# Altium footprint library Component.PcbLib: 115 footprints (part 5 of 8)
Each footprint in its own frame and in the unit in brackets; x right, y up, seen from the top. Pads: shape width x height; smd on the part's side, far side on the other; paste and mask are expansions set on the pad; w line width, h text height; cw(c..) or ccw(c..) is an arc to the next point about the centre after c.
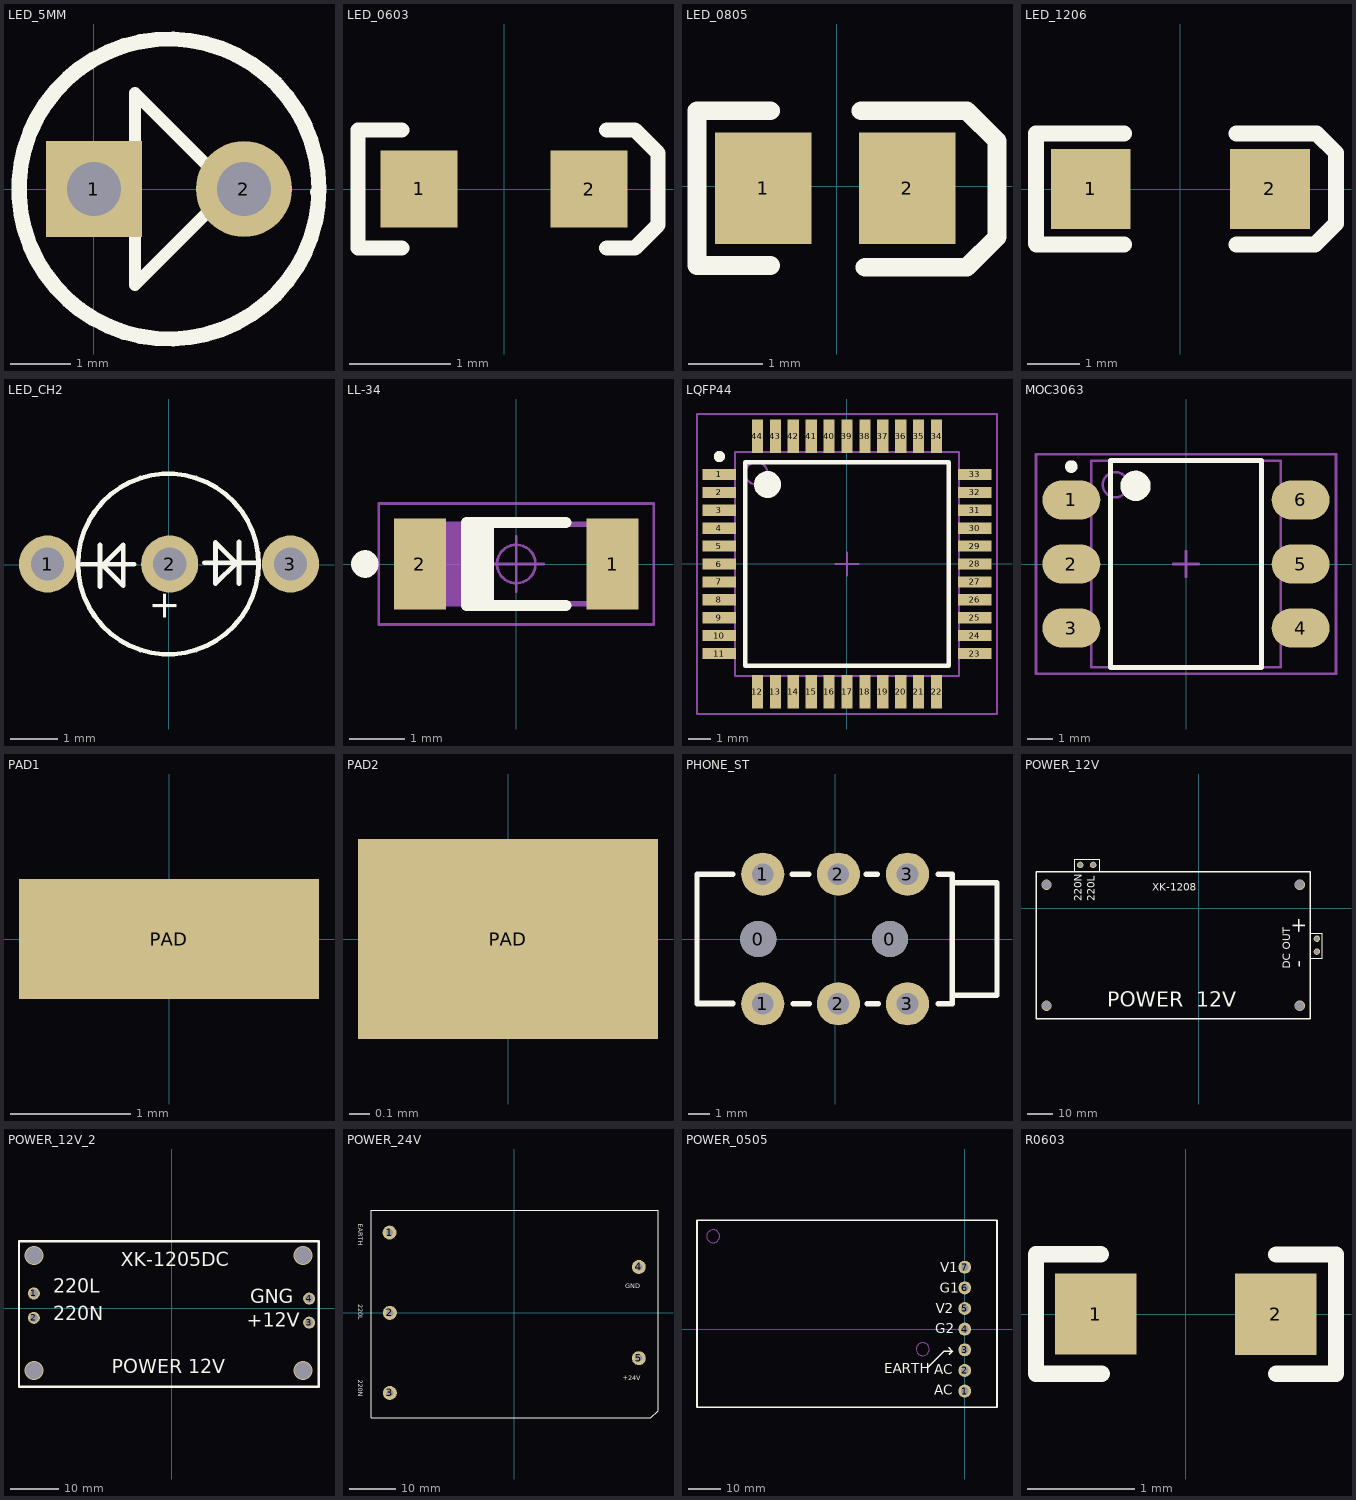
[diagram p4: the footprints below, top view; thin cyan lines are the x and y axes]

## LED_5MM [mm]
height 1.99
pads (2):
  rect 1.6x1.6 hole 0.9: 1(0,0)
  round 1.6 hole 0.9: 2(2.5,0)
Top Overlay:
  circle w0.254: c1.25,0 r2.5
  lines w0.2: 3.7,-0.05 3.75,0 ; 0.68,-1.6 0.68,1.6 2.28,0 0.68,-1.6
3D body: height 9.5, standoff -4, extent -1.476,-3 4.024,3

## LED_0603 [mil]
pads (2):
  rect 30x30 smd: 1(-33.16,0.03) 2(33.16,-0.03)
Top Overlay:
  lines w6: -40,-23 -57,-23 -57,23 -40,23 ; 40,-23 51,-23 60,-14 60,14 51,23 40,23
3D body: height 17.72, standoff 0, extent -31.89,-15.35 31.1,16.14

## LED_0805 [mm]
pads (2):
  rect 1.3x1.5 smd: 1(-0.991,-0.025) 2(0.95,-0.025)
Top Overlay:
  lines w0.254: -0.889,-1.067 -1.88,-1.067 -1.88,1.016 -0.889,1.016 ; 0.33,1.016 1.753,1.016 2.159,0.61 2.159,-0.686 1.753,-1.092 0.381,-1.092
3D body: height 1.1, standoff 0, extent -0.98,-0.655 1.04,0.595

## LED_1206 [mil]
pads (2):
  rect 60x60 smd: 1(-67.5,0) 2(67.5,0)
Top Overlay:
  lines w12: -108.76,-40.94 -108.76,41.73 -42.5,41.73 ; -108.37,-41.73 -42.62,-41.73 ; 42.42,-41.73 101.48,-41.73 116.04,-27.17 117.22,-25.98 117.22,27.17 102.66,41.73 101.87,41.73 42.42,41.73
3D body: height 43.81, standoff -15.9, extent -64.18,-31.89 61.82,31.11

## LED_CH2 [mm]
pads (3):
  round 1.2 hole 0.7: 1(-2.555,0.015) 2(0.015,0.015) 3(2.555,0.015)
Top Overlay:
  circle w0.1: c-0.015,0.015 r1.9
  lines w0.1: -1.83,0.01 -0.73,0.01 ; -1.45,-0.46 -1.45,0.42 ; 0.74,0.04 1.86,0.04 ; 1.47,-0.395 1.47,0.485 ; -1.39,-0.01 -0.96,0.42 -0.96,-0.44 -1.39,-0.01 ; 0.98,-0.395 0.98,0.465 1.41,0.035 0.98,-0.395
  text "+" at 0.365,-1.195 h1

## LL-34 [mm]
pads (2):
  rect 0.95x1.65 smd: 1(1.75,0) 2(-1.75,0)
Top Overlay:
  circle w0.25: c-2.75,0 r0.125
  lines w0.2: -0.7,-0.75 -0.7,0.75 ; -0.5,-0.75 -0.5,0.75 ; 0.9,-0.75 -0.9,-0.75 -0.9,0.75 0.9,0.75
Mechanical 15:
  lines w0.1: -1.65,-0.725 -1.65,0.725 ; -1.55,-0.725 -1.55,0.725 ; -1.45,-0.725 -1.45,0.725 ; -1.35,-0.725 -1.35,0.725 ; -1.25,-0.725 -1.25,0.725 ; -1.15,-0.725 -1.15,0.725 ; -1.05,-0.725 -1.05,0.725 ; -1.75,-0.725 1.75,-0.725 1.75,0.725 -1.75,0.725 -1.75,-0.725
Mechanical 16:
  circle w0.05: c0,0 r0.35
  lines w0.001: -1.8,-0.75 1.8,-0.75 1.8,0.75 -1.8,0.75 -1.8,-0.75
  lines w0.05: -0.5,0 0.5,0 ; 0,-0.5 0,0.5 ; -2.5,-1.1 2.5,-1.1 2.5,1.1 -2.5,1.1 -2.5,-1.1
3D body: height 1.5, standoff 0, extent -1.75,-0.75 1.75,0.75

## LQFP44 [mm] "TQFP, 44-Leads, Body 12.0x12.0mm (max), Pitch 0.80mm, IPC Medium Density"
height 1.6
pads (44):
  rect 1.5x0.5 smd: 1(-5.7,4) 2(-5.7,3.2) 3(-5.7,2.4) 4(-5.7,1.6) 5(-5.7,0.8) 6(-5.7,0) 7(-5.7,-0.8) 8(-5.7,-1.6) 9(-5.7,-2.4) 10(-5.7,-3.2) 11(-5.7,-4) 23(5.7,-4) 24(5.7,-3.2) 25(5.7,-2.4) 26(5.7,-1.6) 27(5.7,-0.8) 28(5.7,0) 29(5.7,0.8) 30(5.7,1.6) 31(5.7,2.4) 32(5.7,3.2) 33(5.7,4)
  rect 0.5x1.5 smd: 12(-4,-5.7) 13(-3.2,-5.7) 14(-2.4,-5.7) 15(-1.6,-5.7) 16(-0.8,-5.7) 17(0,-5.7) 18(0.8,-5.7) 19(1.6,-5.7) 20(2.4,-5.7) 21(3.2,-5.7) 22(4,-5.7) 34(4,5.7) 35(3.2,5.7) 36(2.4,5.7) 37(1.6,5.7) 38(0.8,5.7) 39(0,5.7) 40(-0.8,5.7) 41(-1.6,5.7) 42(-2.4,5.7) 43(-3.2,5.7) 44(-4,5.7)
Top Overlay:
  circle w0.6: c-3.55,3.55 r0.3
  circle w0.25: c-5.7,4.8 r0.125
  lines w0.2: -4.55,-4.55 4.55,-4.55 4.55,4.55 -4.55,4.55 -4.55,-4.55
Mechanical 13:
  circle w0.1: c-4.05,4.05 r0.5
  lines w0.1: -5,-5 5,-5 5,5 -5,5 -5,-5
Mechanical 15:
  lines w0.1: -0.5,0 0.5,0 ; 0,-0.5 0,0.5 ; -6.7,-6.7 6.7,-6.7 6.7,6.7 -6.7,6.7 -6.7,-6.7
3D body: height 1.1, standoff 0, extent -6.02,-6.04 5.98,5.96

## MOC3063 [mm] "SOP, 6-Leads, Body 8.2x7.5mm (max), Pitch 2.54mm, IPC Medium Density"
height 2.65
pads (6):
  oval 2.3x1.55 smd: 1(-4.55,2.54) 2(-4.55,0) 3(-4.55,-2.54) 4(4.55,-2.54) 5(4.55,0) 6(4.55,2.54)
Top Overlay:
  circle w0.25: c-4.55,3.865 r0.125
  circle w0.6: c-2,3.1 r0.3
  lines w0.2: -3,-4.1 -3,4.1 3,4.1 3,-4.1 -3,-4.1
Mechanical 13:
  circle w0.1: c-2.8,3.145 r0.5
  lines w0.1: -3.75,-4.095 -3.75,4.095 3.75,4.095 3.75,-4.095 -3.75,-4.095
Mechanical 15:
  lines w0.1: -0.5,0 0.5,0 ; 0,-0.5 0,0.5 ; -5.95,-4.35 -5.95,4.35 5.95,4.35 5.95,-4.35 -5.95,-4.35
3D body: height 2.65, standoff 0.1, extent -3.75,-4.095 3.75,4.095

## PAD1 [mm] "2.5mm x 1mm"
pads (1):
  rect 2.5x1 smd: PAD(0,0)

## PAD2 [mm] "1.5mm x 1mm"
pads (1):
  rect 1.5x1 smd: PAD(0,0)

## PHONE_ST [mm]
pads (8):
  round 1.676 hole 1.676: 0(-3.556,0) 0(2.54,0)
  round 2 hole 1: 1(-3.35,-3) 1(-3.35,3) 2(0.15,-3) 2(0.15,3) 3(3.35,-3) 3(3.35,3)
Top Overlay:
  lines w0.254: -6.393,-2.969 -4.742,-2.969 ; -4.742,-3.007 -6.393,-3.007 -6.393,3 -4.742,3 ; -1.986,3 -1.224,3 ; -1.948,-3.007 -1.186,-3.007 ; 1.443,3 1.951,3 ; 1.481,-3.007 1.989,-3.007 ; 4.783,-3.007 5.33,-3.007 ; 4.783,3 5.418,3 5.418,-3.007 ; 5.418,-2.6 7.493,-2.6 7.493,2.6 5.418,2.6

## POWER_12V [mm] "XK-1208"
pads (4):
  round 2.5 hole 1.7: 1(-40.88,16.83) 2(-45.91,16.83) 3(45.91,-11.8) 4(45.91,-16.83)
via -59,9.17 diameter 4 hole 3.5
via -59,-37.79 diameter 4 hole 3.5
via 39.25,-37.84 diameter 4 hole 3.5
via 39.26,9.15 diameter 4 hole 3.5
Top Overlay:
  lines w0.2: -63.07,14.19 -59,14.19 ; -48.02,14.29 -47.99,14.32 -47.99,18.98 -47.96,19.01 -38.3,19.01 -38.3,14.29 ; 43.37,-19.41 48.09,-19.41 48.09,-9.75 48.06,-9.72 43.4,-9.72 43.37,-9.69
  lines w0.5: -63.07,-42.87 -63.07,14.19 43.33,14.19 43.33,-42.87 -63.07,-42.87
  text "XK-1208" at -17.92,5.87 h5
  text "-    +" at 43.33,-22.99 h10
  text "POWER  12V" at -35.37,-40.24 h10
  text "DC OUT" at 36.5,-23.54 h5
  text "220L" at -39.28,2.81 h5
  text "220N" at -44.36,2.71 h5

## POWER_12V_2 [mm] "XK-1205DC"
pads (4):
  round 2.5 hole 1.7: 1(-28.66,3.035) 2(-28.66,-2.045) 3(28.66,-3.035) 4(28.66,1.965)
via -28.66,-13.035 diameter 4 hole 3.5
via 27.4,-13.035 diameter 4 hole 3.5
via 27.4,10.965 diameter 4 hole 3.5
via -28.66,10.965 diameter 4 hole 3.5
Top Overlay:
  lines w0.2: -31.75,13.955 -27.99,13.955 -27.95,13.915 ; 30.61,-12.785 30.65,-12.825 30.65,-16.335 ; 30.64,-16.435 30.65,-16.445 ; 30.64,-6.505 30.71,-6.435
  lines w0.5: -31.76,-16.435 30.64,-16.435 30.64,13.915 -31.76,13.915 ; -31.75,-16.395 -31.75,13.955
  text "XK-1205DC" at -10.53,7.675 h5
  text "POWER 12V" at -12.45,-14.605 h5
  text "220L" at -24.62,2.135 h5
  text "220N" at -24.62,-3.625 h5
  text "+12V" at 15.63,-4.925 h5
  text "GNG" at 16.41,-0.055 h5

## POWER_24V [mil]
height 78.35
pads (5):
  round 120 hole 60: 1(-1068.51,687.45) 2(-1066.62,-0.45) 3(-1066.62,-687.45) 4(1068.51,393.55) 5(1068.51,-389.45)
Top Overlay:
  lines w10: -1069.62,688.55 -1066.62,685.55 ; -1226.62,-900.45 1113.38,-900.45 1172.38,-900.45 1233.38,-839.45 1233.38,-780.45 1233.38,799.55 1233.38,819.55 1233.38,879.55 1173.38,879.55 -1226.62,879.55 -1226.62,-900.45
  text "EARTH" at -1339.54,764.54 h40
  text "220L" at -1339.54,73.21 h40
  text "220N" at -1339.54,-575.83 h40
  text "+24V" at 929.41,-579.67 h40
  text "GND" at 953.03,211.67 h40

## POWER_0505 [mm]
pads (7):
  round 4 hole 2.4: 1(0,-19.2) 2(0,-12.8) 3(0,-6.4) 4(0,0) 5(0,6.4) 6(0,12.8) 7(0,19.2)
Top Overlay:
  lines w0.2: -83,-24.41 -83,33.59
  lines w0.5: -11.5,-11.9 -6.5,-6.9 -3.8,-6.9 ; -4.9,-5.8 -3.8,-6.9 ; -4.8,-7.8 -3.9,-6.9 -3.8,-6.9
  lines w0.508: -83,-24.2 -83,33.8 10,33.8 10,-24.2 -83,-24.2
  text "AC" at -9.4,-20.4 h3
  text "AC" at -9.4,-14.05 h3
  text "EARTH" at -24.9,-13.6 h3
  text "G2" at -9.1,-1.35 h3
  text "V2" at -8.943,5 h3
  text "G1" at -7.815,11.35 h3
  text "V1" at -7.658,17.7 h3
Mechanical 1:
  circle w0.254: c-78,28.8 r2
  circle w0.254: c-13,-6.2 r2

## R0603 [mil]
pads (2):
  rect 30x30 smd: 1(-33.16,0.03) 2(33.16,-0.03)
Top Overlay:
  lines w6: -31.35,22.08 -55.17,22.08 -55.17,-22.02 -30.96,-22.02 ; 33.21,-22.02 55.26,-22.02 55.26,21.92 33.21,21.92
3D body: height 17.72, standoff 0, extent -31.89,-15.35 31.1,16.14